# Altium footprint library ICs And Semiconductors THD.PcbLib: 350 footprints (part 11 of 22)
Each footprint in its own frame and in the unit in brackets; x right, y up, seen from the top. Pads: shape width x height; smd on the part's side, far side on the other; paste and mask are expansions set on the pad; w line width, h text height; cw(c..) or ccw(c..) is an arc to the next point about the centre after c.
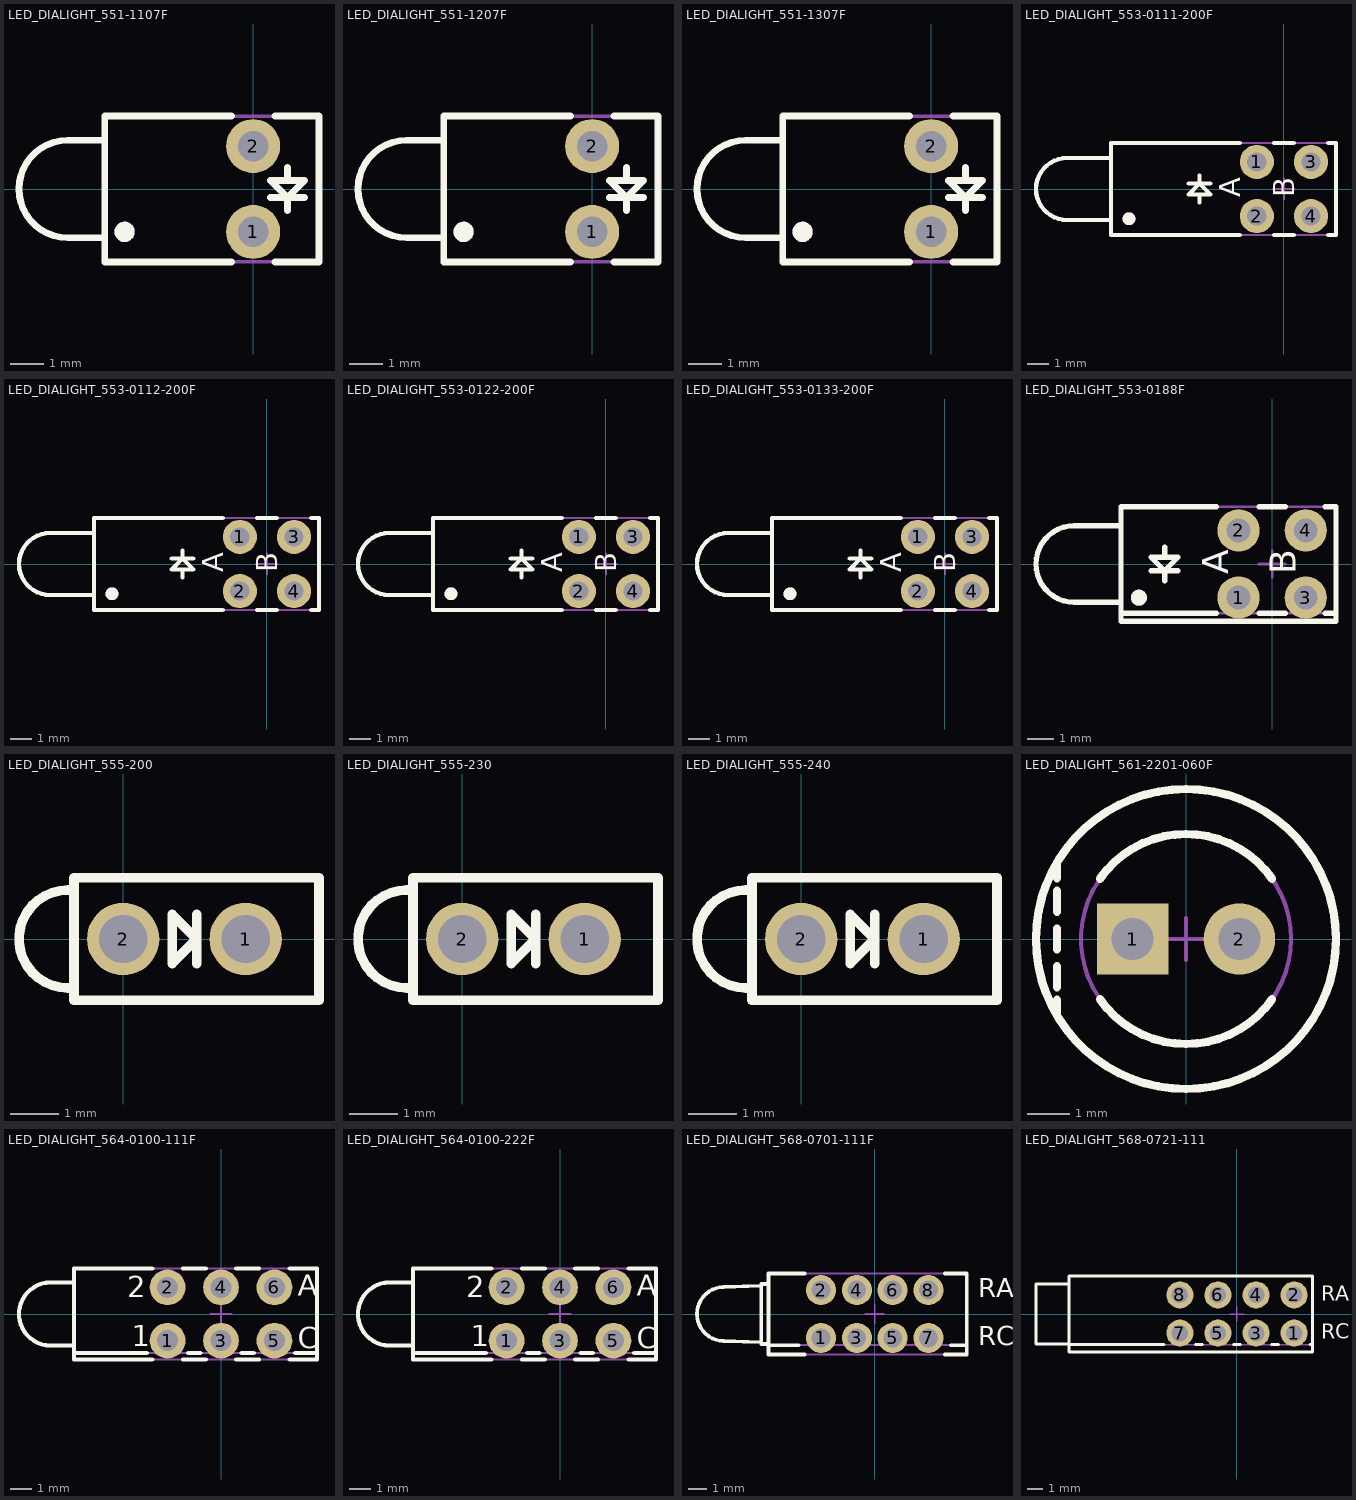
[diagram p10: the footprints below, top view; thin cyan lines are the x and y axes]

## LED_DIALIGHT_551-1107F [mm] "Single 3mm Red LED, Body 6.35x4.32mm, Pin spacing 2.54mm"
height 7.11
pads (2):
  round 1.6 hole 0.9: 1(0,-1.27) 2(0,1.27)
Top Overlay:
  circle w0.3: c-3.81,-1.27 r0.15
  lines w0.2: -4.4,-1.445 -5.495,-1.445 cw(c-5.495,0) -5.495,1.445 -4.4,1.445 ; -0.646,-2.16 -4.4,-2.16 -4.4,2.16 -0.646,2.16 ; 0.508,-0.254 1.524,-0.254 ; 0.646,-2.16 1.95,-2.16 1.95,2.16 0.646,2.16 ; 1.016,-0.635 1.016,-0.254 ; 1.016,0.254 1.016,0.635 ; 1.016,-0.254 1.524,0.254 0.508,0.254 1.016,-0.254
Notvisible:
  lines w0.1: -0.5,-1.27 0,-1.27 ; -0.5,1.27 0,1.27 ; 0,-1.77 0,-1.27 ; 0,-0.77 0,-1.27 ; 0,0.77 0,1.27 ; 0,1.77 0,1.27 ; 0.5,-1.27 0,-1.27 ; 0.5,1.27 0,1.27
Mechanical 14:
  circle w0.3: c-3.81,-1.27 r0.15
  lines w0.1: -4.4,-1.445 -5.495,-1.445 cw(c-5.495,0) -5.495,1.445 -4.4,1.445 ; 1.016,-0.635 1.016,-0.254 ; 1.016,0.254 1.016,0.635 ; 0.508,-0.254 1.524,-0.254 ; 0.508,-0.254 1.524,-0.254 ; 0.508,-0.254 1.524,-0.254 ; 0.508,0.254 1.524,0.254 ; 0.508,0.254 1.016,-0.254 ; 0.508,0.254 1.016,-0.254 ; 0.508,0.254 1.524,0.254 ; 0.508,0.254 1.524,0.254 ; 0.508,0.254 1.016,-0.254 ; 1.016,-0.254 1.524,0.254 ; 1.016,-0.254 1.524,0.254 ; 1.016,-0.254 1.524,0.254 ; -4.4,-2.16 1.95,-2.16 1.95,2.16 -4.4,2.16 -4.4,-2.16
3D body "LED_DIALIGHT_551-1107F.stp": height 7.11, standoff -3.68, extent -6.94,-2.16 1.95,2.16

## LED_DIALIGHT_551-1207F [mm] "Single 3mm Yellow LED, Body 6.35x4.32mm, Pin spacing 2.54mm"
height 7.11
pads (2):
  round 1.6 hole 0.9: 1(0,-1.27) 2(0,1.27)
Top Overlay:
  circle w0.3: c-3.81,-1.27 r0.15
  lines w0.2: -4.4,-1.445 -5.495,-1.445 cw(c-5.495,0) -5.495,1.445 -4.4,1.445 ; -0.646,-2.16 -4.4,-2.16 -4.4,2.16 -0.646,2.16 ; 0.508,-0.254 1.524,-0.254 ; 0.646,-2.16 1.95,-2.16 1.95,2.16 0.646,2.16 ; 1.016,-0.635 1.016,-0.254 ; 1.016,0.254 1.016,0.635 ; 1.016,-0.254 1.524,0.254 0.508,0.254 1.016,-0.254
Notvisible:
  lines w0.1: -0.5,-1.27 0,-1.27 ; -0.5,1.27 0,1.27 ; 0,-1.77 0,-1.27 ; 0,-0.77 0,-1.27 ; 0,0.77 0,1.27 ; 0,1.77 0,1.27 ; 0.5,-1.27 0,-1.27 ; 0.5,1.27 0,1.27
Mechanical 14:
  circle w0.3: c-3.81,-1.27 r0.15
  lines w0.1: -4.4,-1.445 -5.495,-1.445 cw(c-5.495,0) -5.495,1.445 -4.4,1.445 ; 1.016,-0.635 1.016,-0.254 ; 1.016,0.254 1.016,0.635 ; 0.508,-0.254 1.524,-0.254 ; 0.508,-0.254 1.524,-0.254 ; 0.508,-0.254 1.524,-0.254 ; 0.508,0.254 1.524,0.254 ; 0.508,0.254 1.016,-0.254 ; 0.508,0.254 1.016,-0.254 ; 0.508,0.254 1.524,0.254 ; 0.508,0.254 1.524,0.254 ; 0.508,0.254 1.016,-0.254 ; 1.016,-0.254 1.524,0.254 ; 1.016,-0.254 1.524,0.254 ; 1.016,-0.254 1.524,0.254 ; -4.4,-2.16 1.95,-2.16 1.95,2.16 -4.4,2.16 -4.4,-2.16
3D body "LED_DIALIGHT_551-1207F.stp": height 7.11, standoff -3.68, extent -6.94,-2.16 1.95,2.16

## LED_DIALIGHT_551-1307F [mm] "Single 3mm Green LED, Body 6.35x4.32mm, Pin spacing 2.54mm"
height 7.11
pads (2):
  round 1.6 hole 0.9: 1(0,-1.27) 2(0,1.27)
Top Overlay:
  circle w0.3: c-3.81,-1.27 r0.15
  lines w0.2: -4.4,-1.445 -5.495,-1.445 cw(c-5.495,0) -5.495,1.445 -4.4,1.445 ; -0.646,-2.16 -4.4,-2.16 -4.4,2.16 -0.646,2.16 ; 0.508,-0.254 1.524,-0.254 ; 0.646,-2.16 1.95,-2.16 1.95,2.16 0.646,2.16 ; 1.016,-0.635 1.016,-0.254 ; 1.016,0.254 1.016,0.635 ; 1.016,-0.254 0.508,0.254 1.524,0.254 1.016,-0.254
Notvisible:
  lines w0.1: -0.5,-1.27 0,-1.27 ; -0.5,1.27 0,1.27 ; 0,-1.77 0,-1.27 ; 0,-0.77 0,-1.27 ; 0,0.77 0,1.27 ; 0,1.77 0,1.27 ; 0.5,-1.27 0,-1.27 ; 0.5,1.27 0,1.27
Mechanical 14:
  circle w0.3: c-3.81,-1.27 r0.15
  lines w0.1: -4.4,-1.445 -5.495,-1.445 cw(c-5.495,0) -5.495,1.445 -4.4,1.445 ; 1.016,-0.635 1.016,-0.254 ; 1.016,0.254 1.016,0.635 ; 0.508,-0.254 1.524,-0.254 ; 0.508,-0.254 1.524,-0.254 ; 0.508,-0.254 1.524,-0.254 ; 0.508,0.254 1.016,-0.254 ; 0.508,0.254 1.524,0.254 ; 0.508,0.254 1.524,0.254 ; 0.508,0.254 1.016,-0.254 ; 0.508,0.254 1.016,-0.254 ; 0.508,0.254 1.524,0.254 ; 1.016,-0.254 1.524,0.254 ; 1.016,-0.254 1.524,0.254 ; 1.016,-0.254 1.524,0.254 ; -4.4,-2.16 -4.4,2.16 1.95,2.16 1.95,-2.16 -4.4,-2.16
3D body "LED_DIALIGHT_551-1307F.stp": height 7.11, standoff -3.68, extent -6.94,-2.16 1.95,2.16

## LED_DIALIGHT_553-0111-200F [mm] "Dual 3mm Red LED, Body 10.55x4.32mm, Pin spacing 2.54mm"
height 9.65
pads (4):
  round 1.6 hole 0.9: 1(-1.27,1.27) 2(-1.27,-1.27) 3(1.27,1.27) 4(1.27,-1.27)
Top Overlay:
  circle w0.3: c-7.262,-1.397 r0.15
  lines w0.2: -8.11,-1.45 -10.17,-1.45 cw(c-10.17,0) -10.17,1.45 -8.11,1.45 ; -4.464,0.254 -3.448,0.254 ; -3.956,-0.635 -3.956,-0.254 ; -3.956,0.635 -3.956,0.254 ; -2.075,-2.16 -8.11,-2.16 -8.11,2.16 -2.075,2.16 ; -0.465,-2.16 0.465,-2.16 ; -0.465,2.16 0.465,2.16 ; 2.075,-2.16 2.44,-2.16 2.44,2.16 2.075,2.16 ; -3.956,0.254 -4.464,-0.254 -3.448,-0.254 -3.956,0.254
  text "A" at -2.051,-0.381 h1
  text "B" at 0.489,-0.381 h1
Notvisible:
  lines w0.1: -1.77,-1.27 -1.27,-1.27 ; -1.77,1.27 -1.27,1.27 ; -1.27,-1.77 -1.27,-1.27 ; -1.27,-0.77 -1.27,-1.27 ; -1.27,0.77 -1.27,1.27 ; -1.27,1.77 -1.27,1.27 ; -0.77,-1.27 -1.27,-1.27 ; -0.77,1.27 -1.27,1.27 ; -0.5,0 0,0 ; 0,-0.5 0,0 ; 0,0.5 0,0 ; 0.5,0 0,0 ; 0.77,-1.27 1.27,-1.27 ; 0.77,1.27 1.27,1.27 ; 1.27,-1.77 1.27,-1.27 ; 1.27,-0.77 1.27,-1.27 ; 1.27,0.77 1.27,1.27 ; 1.27,1.77 1.27,1.27 ; 1.77,-1.27 1.27,-1.27 ; 1.77,1.27 1.27,1.27
Mechanical 14:
  circle w0.3: c-7.262,-1.397 r0.15
  lines w0.1: -8.11,-1.45 -10.17,-1.45 cw(c-10.17,0) -10.17,1.45 -8.11,1.45 ; -3.956,-0.635 -3.956,-0.254 ; -3.956,0.635 -3.956,0.254 ; -4.464,-0.254 -3.448,-0.254 ; -4.464,-0.254 -3.956,0.254 ; -4.464,-0.254 -3.956,0.254 ; -4.464,-0.254 -3.448,-0.254 ; -4.464,-0.254 -3.448,-0.254 ; -4.464,-0.254 -3.956,0.254 ; -4.464,0.254 -3.448,0.254 ; -4.464,0.254 -3.448,0.254 ; -4.464,0.254 -3.448,0.254 ; -3.956,0.254 -3.448,-0.254 ; -3.956,0.254 -3.448,-0.254 ; -3.956,0.254 -3.448,-0.254 ; -8.11,-2.16 2.44,-2.16 2.44,2.16 -8.11,2.16 -8.11,-2.16
  text "A" at -2.051,-0.381 h1
  text "B" at 0.489,-0.381 h1
3D body "LED_DIALIGHT_553-0111-200F.stp": height 9.65, standoff -3.68, extent -11.62,-2.16 2.44,2.16

## LED_DIALIGHT_553-0112-200F [mm] "Dual 3mm LED  (Top: Red, Bot: Green), Body 10.55x4.32mm, Pin spacing 2.54mm"
height 9.65
pads (4):
  round 1.6 hole 0.9: 1(-1.27,1.27) 2(-1.27,-1.27) 3(1.27,1.27) 4(1.27,-1.27)
Top Overlay:
  circle w0.3: c-7.262,-1.397 r0.15
  lines w0.2: -8.11,-1.45 -10.17,-1.45 cw(c-10.17,0) -10.17,1.45 -8.11,1.45 ; -4.464,0.254 -3.448,0.254 ; -3.956,-0.635 -3.956,-0.254 ; -3.956,0.635 -3.956,0.254 ; -2.075,-2.16 -8.11,-2.16 -8.11,2.16 -2.075,2.16 ; -0.465,-2.16 0.465,-2.16 ; -0.465,2.16 0.465,2.16 ; 2.075,-2.16 2.44,-2.16 2.44,2.16 2.075,2.16 ; -3.956,0.254 -3.448,-0.254 -4.464,-0.254 -3.956,0.254
  text "B" at 0.489,-0.381 h1
  text "A" at -2.051,-0.381 h1
Notvisible:
  lines w0.1: -1.77,-1.27 -1.27,-1.27 ; -1.77,1.27 -1.27,1.27 ; -1.27,-1.77 -1.27,-1.27 ; -1.27,-0.77 -1.27,-1.27 ; -1.27,0.77 -1.27,1.27 ; -1.27,1.77 -1.27,1.27 ; -0.77,-1.27 -1.27,-1.27 ; -0.77,1.27 -1.27,1.27 ; -0.5,0 0,0 ; 0,-0.5 0,0 ; 0,0.5 0,0 ; 0.5,0 0,0 ; 0.77,-1.27 1.27,-1.27 ; 0.77,1.27 1.27,1.27 ; 1.27,-1.77 1.27,-1.27 ; 1.27,-0.77 1.27,-1.27 ; 1.27,0.77 1.27,1.27 ; 1.27,1.77 1.27,1.27 ; 1.77,-1.27 1.27,-1.27 ; 1.77,1.27 1.27,1.27
Mechanical 14:
  circle w0.3: c-7.262,-1.397 r0.15
  lines w0.1: -8.11,-1.45 -10.17,-1.45 cw(c-10.17,0) -10.17,1.45 -8.11,1.45 ; -3.956,-0.635 -3.956,-0.254 ; -3.956,0.635 -3.956,0.254 ; -4.464,-0.254 -3.956,0.254 ; -4.464,-0.254 -3.448,-0.254 ; -4.464,-0.254 -3.448,-0.254 ; -4.464,-0.254 -3.956,0.254 ; -4.464,-0.254 -3.956,0.254 ; -4.464,-0.254 -3.448,-0.254 ; -4.464,0.254 -3.448,0.254 ; -4.464,0.254 -3.448,0.254 ; -4.464,0.254 -3.448,0.254 ; -3.956,0.254 -3.448,-0.254 ; -3.956,0.254 -3.448,-0.254 ; -3.956,0.254 -3.448,-0.254 ; -8.11,-2.16 2.44,-2.16 2.44,2.16 -8.11,2.16 -8.11,-2.16
  text "B" at 0.489,-0.381 h1
  text "A" at -2.051,-0.381 h1
3D body "LED_DIALIGHT_553-0112-200F.stp": height 9.65, standoff -3.68, extent -11.62,-2.16 2.44,2.16

## LED_DIALIGHT_553-0122-200F [mm] "Dual 3mm Green LED, Body 10.55x4.32mm, Pin spacing 2.54mm"
height 9.65
pads (4):
  round 1.6 hole 0.9: 1(-1.27,1.27) 2(-1.27,-1.27) 3(1.27,1.27) 4(1.27,-1.27)
Top Overlay:
  circle w0.3: c-7.262,-1.397 r0.15
  lines w0.2: -8.11,-1.45 -10.17,-1.45 cw(c-10.17,0) -10.17,1.45 -8.11,1.45 ; -4.464,0.254 -3.448,0.254 ; -3.956,-0.635 -3.956,-0.254 ; -3.956,0.635 -3.956,0.254 ; -2.075,-2.16 -8.11,-2.16 -8.11,2.16 -2.075,2.16 ; -0.465,-2.16 0.465,-2.16 ; -0.465,2.16 0.465,2.16 ; 2.075,-2.16 2.44,-2.16 2.44,2.16 2.075,2.16 ; -3.956,0.254 -4.464,-0.254 -3.448,-0.254 -3.956,0.254
  text "A" at -2.051,-0.381 h1
  text "B" at 0.489,-0.381 h1
Notvisible:
  lines w0.1: -1.77,-1.27 -1.27,-1.27 ; -1.77,1.27 -1.27,1.27 ; -1.27,-1.77 -1.27,-1.27 ; -1.27,-0.77 -1.27,-1.27 ; -1.27,0.77 -1.27,1.27 ; -1.27,1.77 -1.27,1.27 ; -0.77,-1.27 -1.27,-1.27 ; -0.77,1.27 -1.27,1.27 ; -0.5,0 0,0 ; 0,-0.5 0,0 ; 0,0.5 0,0 ; 0.5,0 0,0 ; 0.77,-1.27 1.27,-1.27 ; 0.77,1.27 1.27,1.27 ; 1.27,-1.77 1.27,-1.27 ; 1.27,-0.77 1.27,-1.27 ; 1.27,0.77 1.27,1.27 ; 1.27,1.77 1.27,1.27 ; 1.77,-1.27 1.27,-1.27 ; 1.77,1.27 1.27,1.27
Mechanical 14:
  circle w0.3: c-7.262,-1.397 r0.15
  lines w0.1: -8.11,-1.45 -10.17,-1.45 cw(c-10.17,0) -10.17,1.45 -8.11,1.45 ; -3.956,-0.635 -3.956,-0.254 ; -3.956,0.635 -3.956,0.254 ; -4.464,-0.254 -3.448,-0.254 ; -4.464,-0.254 -3.956,0.254 ; -4.464,-0.254 -3.956,0.254 ; -4.464,-0.254 -3.448,-0.254 ; -4.464,-0.254 -3.448,-0.254 ; -4.464,-0.254 -3.956,0.254 ; -4.464,0.254 -3.448,0.254 ; -4.464,0.254 -3.448,0.254 ; -4.464,0.254 -3.448,0.254 ; -3.956,0.254 -3.448,-0.254 ; -3.956,0.254 -3.448,-0.254 ; -3.956,0.254 -3.448,-0.254 ; -8.11,-2.16 -8.11,2.16 2.44,2.16 2.44,-2.16 -8.11,-2.16
  text "A" at -2.051,-0.381 h1
  text "B" at 0.489,-0.381 h1
3D body "LED_DIALIGHT_553-0122-200F.stp": height 9.65, standoff -3.68, extent -11.62,-2.16 2.44,2.16

## LED_DIALIGHT_553-0133-200F [mm] "Dual 3mm Yellow LED, Body 10.55x4.32mm, Pin spacing 2.54mm"
height 9.65
pads (4):
  round 1.6 hole 0.9: 1(-1.27,1.27) 2(-1.27,-1.27) 3(1.27,1.27) 4(1.27,-1.27)
Top Overlay:
  circle w0.3: c-7.262,-1.397 r0.15
  lines w0.2: -8.11,-1.45 -10.17,-1.45 cw(c-10.17,0) -10.17,1.45 -8.11,1.45 ; -4.464,0.254 -3.448,0.254 ; -3.956,-0.635 -3.956,-0.254 ; -3.956,0.635 -3.956,0.254 ; -2.075,-2.16 -8.11,-2.16 -8.11,2.16 -2.075,2.16 ; -0.465,-2.16 0.465,-2.16 ; -0.465,2.16 0.465,2.16 ; 2.075,-2.16 2.44,-2.16 2.44,2.16 2.075,2.16 ; -3.956,0.254 -4.464,-0.254 -3.448,-0.254 -3.956,0.254
  text "A" at -2.051,-0.381 h1
  text "B" at 0.489,-0.381 h1
Notvisible:
  lines w0.1: -1.77,-1.27 -1.27,-1.27 ; -1.77,1.27 -1.27,1.27 ; -1.27,-1.77 -1.27,-1.27 ; -1.27,-0.77 -1.27,-1.27 ; -1.27,0.77 -1.27,1.27 ; -1.27,1.77 -1.27,1.27 ; -0.77,-1.27 -1.27,-1.27 ; -0.77,1.27 -1.27,1.27 ; -0.5,0 0,0 ; 0,-0.5 0,0 ; 0,0.5 0,0 ; 0.5,0 0,0 ; 0.77,-1.27 1.27,-1.27 ; 0.77,1.27 1.27,1.27 ; 1.27,-1.77 1.27,-1.27 ; 1.27,-0.77 1.27,-1.27 ; 1.27,0.77 1.27,1.27 ; 1.27,1.77 1.27,1.27 ; 1.77,-1.27 1.27,-1.27 ; 1.77,1.27 1.27,1.27
Mechanical 14:
  circle w0.3: c-7.262,-1.397 r0.15
  lines w0.1: -8.11,-1.45 -10.17,-1.45 cw(c-10.17,0) -10.17,1.45 -8.11,1.45 ; -3.956,-0.635 -3.956,-0.254 ; -3.956,0.635 -3.956,0.254 ; -4.464,-0.254 -3.448,-0.254 ; -4.464,-0.254 -3.956,0.254 ; -4.464,-0.254 -3.956,0.254 ; -4.464,-0.254 -3.448,-0.254 ; -4.464,-0.254 -3.448,-0.254 ; -4.464,-0.254 -3.956,0.254 ; -4.464,0.254 -3.448,0.254 ; -4.464,0.254 -3.448,0.254 ; -4.464,0.254 -3.448,0.254 ; -3.956,0.254 -3.448,-0.254 ; -3.956,0.254 -3.448,-0.254 ; -3.956,0.254 -3.448,-0.254 ; -8.11,-2.16 -8.11,2.16 2.44,2.16 2.44,-2.16 -8.11,-2.16
  text "A" at -2.051,-0.381 h1
  text "B" at 0.489,-0.381 h1
3D body "LED_DIALIGHT_553-0133-200F.stp": height 9.65, standoff -3.68, extent -11.62,-2.16 2.44,2.16

## LED_DIALIGHT_553-0188F [mm] "Dual 3mm Blue LED, Body 8.1x4.3mm, Pin spacing 2.54mm"
height 9.65
pads (4):
  round 1.6 hole 0.9: 1(-1.27,-1.27) 2(-1.27,1.27) 3(1.27,-1.27) 4(1.27,1.27)
Top Overlay:
  circle w0.3: c-5.037,-1.272 r0.15
  lines w0.2: -5.715,-1.86 -2.1,-1.86 ; -5.715,-1.45 -7.475,-1.45 cw(c-7.475,0) -7.475,1.45 -5.715,1.45 ; -4.572,-0.254 -3.556,-0.254 ; -4.064,-0.635 -4.064,-0.254 ; -4.064,0.254 -4.064,0.635 ; -2.1,2.16 -5.715,2.16 -5.715,-2.16 2.413,-2.16 2.413,2.16 2,2.16 ; -0.5,-1.86 0.5,-1.86 ; -0.5,2.16 0.5,2.16 ; 2,-1.86 2.413,-1.86 ; -4.064,-0.254 -3.556,0.254 -4.572,0.254 -4.064,-0.254
  text "A" at -1.651,-0.381 h1
  text "B" at 0.889,-0.381 h1
Notvisible:
  lines w0.1: -1.77,-1.27 -1.27,-1.27 ; -1.77,1.27 -1.27,1.27 ; -1.27,-1.77 -1.27,-1.27 ; -1.27,-0.77 -1.27,-1.27 ; -1.27,0.77 -1.27,1.27 ; -1.27,1.77 -1.27,1.27 ; -0.77,-1.27 -1.27,-1.27 ; -0.77,1.27 -1.27,1.27 ; -0.5,0 0,0 ; 0,-0.5 0,0 ; 0,0.5 0,0 ; 0.5,0 0,0 ; 0.77,-1.27 1.27,-1.27 ; 0.77,1.27 1.27,1.27 ; 1.27,-1.77 1.27,-1.27 ; 1.27,-0.77 1.27,-1.27 ; 1.27,0.77 1.27,1.27 ; 1.27,1.77 1.27,1.27 ; 1.77,-1.27 1.27,-1.27 ; 1.77,1.27 1.27,1.27
Mechanical 14:
  circle w0.3: c-5.037,-1.272 r0.15
  lines w0.1: -5.715,-1.86 2.413,-1.86 ; -5.715,-1.45 -7.475,-1.45 cw(c-7.475,0) -7.475,1.45 -5.715,1.45 ; -4.064,-0.635 -4.064,-0.254 ; -4.064,0.254 -4.064,0.635 ; -4.572,-0.254 -3.556,-0.254 ; -4.572,-0.254 -3.556,-0.254 ; -4.572,-0.254 -3.556,-0.254 ; -4.572,0.254 -3.556,0.254 ; -4.572,0.254 -4.064,-0.254 ; -4.572,0.254 -4.064,-0.254 ; -4.572,0.254 -3.556,0.254 ; -4.572,0.254 -3.556,0.254 ; -4.572,0.254 -4.064,-0.254 ; -4.064,-0.254 -3.556,0.254 ; -4.064,-0.254 -3.556,0.254 ; -4.064,-0.254 -3.556,0.254 ; -5.715,-2.16 2.413,-2.16 2.413,2.16 -5.715,2.16 -5.715,-2.16
  text "A" at -1.651,-0.381 h1
  text "B" at 0.889,-0.381 h1
3D body "LED_DIALIGHT_553-0188F.stp": height 9.65, standoff -3.68, extent -8.925,-2.16 2.413,2.16

## LED_DIALIGHT_555-200 [mm] "Single 2mm Red LED, Body 5.08x2.54mm, Pin spacing 2.54mm"
height 6.35
pads (2):
  round 1.5 hole 1: 1(2.54,0) 2(0,0)
Top Overlay:
  lines w0.2: -1.02,-1.015 -1.145,-1.015 cw(c-1.145,0) -1.145,1.015 -1.02,1.015 ; 1.524,-0.508 1.524,0.508 ; -1.02,-1.27 4.06,-1.27 4.06,1.27 -1.02,1.27 -1.02,-1.27 ; 1.016,-0.508 1.524,0 1.016,0.508 1.016,-0.508
Notvisible:
  lines w0.05: -0.127,-0.343 -0.127,0.343 0.127,0.343 0.127,-0.343 -0.127,-0.343 ; 2.413,-0.343 2.413,0.343 2.667,0.343 2.667,-0.343 2.413,-0.343
Mechanical 14:
  lines w0.1: -1.02,-1.015 -1.145,-1.015 cw(c-1.145,0) -1.145,1.015 -1.02,1.015 ; 1.524,-0.508 1.524,0.508 ; -1.02,-1.27 4.06,-1.27 4.06,1.27 -1.02,1.27 -1.02,-1.27 ; 1.016,-0.508 1.524,0 1.016,0.508 1.016,-0.508
3D body "LED_DIALIGHT_555-200.stp": height 6.35, standoff -3.6, extent -2.16,-1.27 4.06,1.27

## LED_DIALIGHT_555-230 [mm] "Single 2mm Green LED, Body 5.08x2.54mm, Pin spacing 2.54mm"
height 6.35
pads (2):
  round 1.5 hole 1: 1(2.54,0) 2(0,0)
Top Overlay:
  lines w0.2: -1.02,-1.015 -1.145,-1.015 cw(c-1.145,0) -1.145,1.015 -1.02,1.015 ; 1.524,-0.508 1.524,0.508 ; -1.02,-1.27 4.06,-1.27 4.06,1.27 -1.02,1.27 -1.02,-1.27 ; 1.016,-0.508 1.524,0 1.016,0.508 1.016,-0.508
Notvisible:
  lines w0.05: -0.127,-0.343 -0.127,0.343 0.127,0.343 0.127,-0.343 -0.127,-0.343 ; 2.413,-0.343 2.413,0.343 2.667,0.343 2.667,-0.343 2.413,-0.343
Mechanical 14:
  lines w0.1: -1.02,-1.015 -1.145,-1.015 cw(c-1.145,0) -1.145,1.015 -1.02,1.015 ; 1.524,-0.508 1.524,0.508 ; -1.02,-1.27 4.06,-1.27 4.06,1.27 -1.02,1.27 -1.02,-1.27 ; 1.016,-0.508 1.524,0 1.016,0.508 1.016,-0.508
3D body "LED_DIALIGHT_555-230.stp": height 6.35, standoff -3.6, extent -2.16,-1.27 4.06,1.27

## LED_DIALIGHT_555-240 [mm] "Single 2mm Yellow LED, Body 5.08x2.54mm, Pin spacing 2.54mm"
height 6.35
pads (2):
  round 1.5 hole 1: 1(2.54,0) 2(0,0)
Top Overlay:
  lines w0.2: -1.02,-1.015 -1.145,-1.015 cw(c-1.145,0) -1.145,1.015 -1.02,1.015 ; 1.524,-0.508 1.524,0.508 ; -1.02,-1.27 4.06,-1.27 4.06,1.27 -1.02,1.27 -1.02,-1.27 ; 1.016,-0.508 1.524,0 1.016,0.508 1.016,-0.508
Notvisible:
  lines w0.05: -0.127,-0.343 -0.127,0.343 0.127,0.343 0.127,-0.343 -0.127,-0.343 ; 2.413,-0.343 2.413,0.343 2.667,0.343 2.667,-0.343 2.413,-0.343
Mechanical 14:
  lines w0.1: -1.02,-1.015 -1.145,-1.015 cw(c-1.145,0) -1.145,1.015 -1.02,1.015 ; 1.524,-0.508 1.524,0.508 ; -1.02,-1.27 4.06,-1.27 4.06,1.27 -1.02,1.27 -1.02,-1.27 ; 1.016,-0.508 1.524,0 1.016,0.508 1.016,-0.508
3D body "LED_DIALIGHT_555-240.stp": height 6.35, standoff -3.6, extent -2.16,-1.27 4.06,1.27

## LED_DIALIGHT_561-2201-060F [mm] "Single Vertical 5mm Green LED With Housing Stand-off (D 7.1mmx H 9.52mm), Overall Height 15.24mm"
height 15.24
pads (2):
  rect 1.7x1.7 hole 1: 1(-1.27,0)
  round 1.7 hole 1: 2(1.27,0)
Top Overlay:
  circle w0.2: c0,0 r3.57
  lines w0.2: -3.07,-1.822 -3.07,-1.45 ; -3.07,-1.15 -3.07,-0.65 ; -3.07,-0.25 -3.07,0.25 ; -3.07,0.65 -3.07,1.15 ; -3.07,1.45 -3.07,1.822 ; -2.048,-1.434 ccw(c0,0) 2.048,-1.434 ; -2.048,1.434 cw(c0,0) 2.048,1.434
Notvisible:
  lines w0.1: -1.77,0 -1.27,0 ; -1.27,-0.5 -1.27,0 ; -1.27,0.5 -1.27,0 ; -0.77,0 -1.27,0 ; -0.5,0 0,0 ; 0,-0.5 0,0 ; 0,0.5 0,0 ; 0.5,0 0,0 ; 0.77,0 1.27,0 ; 1.27,-0.5 1.27,0 ; 1.27,0.5 1.27,0 ; 1.77,0 1.27,0
Mechanical 14:
  circle w0.1: c0,0 r3.57
  circle w0.1: c0,0 r2.5
  lines w0.1: -3.07,-1.822 -3.07,-1.45 ; -3.07,-1.15 -3.07,-0.65 ; -3.07,-0.25 -3.07,0.25 ; -3.07,0.65 -3.07,1.15 ; -3.07,1.45 -3.07,1.822
3D body "LED_DIALIGHT_561-2201-060F.stp": height 15.24, standoff -3.8, extent -3.57,-3.57 3.57,3.57

## LED_DIALIGHT_564-0100-111F [mm] "3x Red LED 3mm PCB Edge Mounting DIALIGHT 564 Serie"
height 15.24
pads (6):
  round 1.7 hole 1: 1(-2.54,-1.27) 2(-2.54,1.27) 3(0,-1.27) 4(0,1.27) 5(2.54,-1.27) 6(2.54,1.27)
Top Overlay:
  lines w0.2: -6.99,-1.86 -3.527,-1.86 ; -6.99,-1.5 -8.106,-1.5 cw(c-8.106,0) -8.106,1.5 -6.99,1.5 ; -3.268,-2.16 -6.99,-2.16 -6.99,2.16 -3.268,2.16 ; -1.812,-2.16 -0.728,-2.16 ; -1.812,2.16 -0.728,2.16 ; -1.553,-1.86 -0.987,-1.86 ; 0.728,-2.16 1.812,-2.16 ; 0.728,2.16 1.812,2.16 ; 0.987,-1.86 1.553,-1.86 ; 3.268,-2.16 4.57,-2.16 4.57,2.16 3.268,2.16 ; 3.527,-1.86 4.57,-1.86
  text "1" at -4.243,-1.53 h1
  text "2" at -4.458,0.79 h1
  text "C" at 3.66,-1.635 h1
  text "A" at 3.66,0.86 h1
Notvisible:
  lines w0.1: -3.04,-1.27 -2.54,-1.27 ; -3.04,1.27 -2.54,1.27 ; -2.54,-1.77 -2.54,-1.27 ; -2.54,-0.77 -2.54,-1.27 ; -2.54,0.77 -2.54,1.27 ; -2.54,1.77 -2.54,1.27 ; -2.04,-1.27 -2.54,-1.27 ; -2.04,1.27 -2.54,1.27 ; -0.5,-1.27 0,-1.27 ; -0.5,0 0,0 ; -0.5,1.27 0,1.27 ; 0,-1.77 0,-1.27 ; 0,-0.77 0,-1.27 ; 0,-0.5 0,0 ; 0,0.5 0,0 ; 0,0.77 0,1.27 ; 0,1.77 0,1.27 ; 0.5,-1.27 0,-1.27 ; 0.5,0 0,0 ; 0.5,1.27 0,1.27 ; 2.04,-1.27 2.54,-1.27 ; 2.04,1.27 2.54,1.27 ; 2.54,-1.77 2.54,-1.27 ; 2.54,-0.77 2.54,-1.27 ; 2.54,0.77 2.54,1.27 ; 2.54,1.77 2.54,1.27 ; 3.04,-1.27 2.54,-1.27 ; 3.04,1.27 2.54,1.27
Mechanical 14:
  lines w0.1: -6.99,-1.86 4.57,-1.86 ; -6.99,-1.5 -8.106,-1.5 cw(c-8.106,0) -8.106,1.5 -6.99,1.5 ; -6.99,-2.16 -6.99,2.16 4.57,2.16 4.57,-2.16 -6.99,-2.16
  text "1" at -4.243,-1.53 h1
  text "2" at -4.458,0.79 h1
  text "C" at 3.66,-1.635 h1
  text "A" at 3.66,0.86 h1
3D body "LED_DIALIGHT_564-0100-111F.stp": height 15.24, standoff -3.2, extent -9.606,-2.16 4.57,2.16

## LED_DIALIGHT_564-0100-222F [mm] "3x Green LED 3mm PCB Edge Mounting DIALIGHT 564 Serie"
height 15.24
pads (6):
  round 1.7 hole 1: 1(-2.54,-1.27) 2(-2.54,1.27) 3(0,-1.27) 4(0,1.27) 5(2.54,-1.27) 6(2.54,1.27)
Top Overlay:
  lines w0.2: -6.99,-1.86 -3.527,-1.86 ; -6.99,-1.5 -8.106,-1.5 cw(c-8.106,0) -8.106,1.5 -6.99,1.5 ; -3.268,-2.16 -6.99,-2.16 -6.99,2.16 -3.268,2.16 ; -1.812,-2.16 -0.728,-2.16 ; -1.812,2.16 -0.728,2.16 ; -1.553,-1.86 -0.987,-1.86 ; 0.728,-2.16 1.812,-2.16 ; 0.728,2.16 1.812,2.16 ; 0.987,-1.86 1.553,-1.86 ; 3.268,-2.16 4.57,-2.16 4.57,2.16 3.268,2.16 ; 3.527,-1.86 4.57,-1.86
  text "1" at -4.243,-1.53 h1
  text "2" at -4.458,0.79 h1
  text "C" at 3.66,-1.635 h1
  text "A" at 3.66,0.86 h1
Notvisible:
  lines w0.1: -3.04,-1.27 -2.54,-1.27 ; -3.04,1.27 -2.54,1.27 ; -2.54,-1.77 -2.54,-1.27 ; -2.54,-0.77 -2.54,-1.27 ; -2.54,0.77 -2.54,1.27 ; -2.54,1.77 -2.54,1.27 ; -2.04,-1.27 -2.54,-1.27 ; -2.04,1.27 -2.54,1.27 ; -0.5,-1.27 0,-1.27 ; -0.5,0 0,0 ; -0.5,1.27 0,1.27 ; 0,-1.77 0,-1.27 ; 0,-0.77 0,-1.27 ; 0,-0.5 0,0 ; 0,0.5 0,0 ; 0,0.77 0,1.27 ; 0,1.77 0,1.27 ; 0.5,-1.27 0,-1.27 ; 0.5,0 0,0 ; 0.5,1.27 0,1.27 ; 2.04,-1.27 2.54,-1.27 ; 2.04,1.27 2.54,1.27 ; 2.54,-1.77 2.54,-1.27 ; 2.54,-0.77 2.54,-1.27 ; 2.54,0.77 2.54,1.27 ; 2.54,1.77 2.54,1.27 ; 3.04,-1.27 2.54,-1.27 ; 3.04,1.27 2.54,1.27
Mechanical 14:
  lines w0.1: -6.99,-1.86 4.57,-1.86 ; -6.99,-1.5 -8.106,-1.5 cw(c-8.106,0) -8.106,1.5 -6.99,1.5 ; -6.99,-2.16 -6.99,2.16 4.57,2.16 4.57,-2.16 -6.99,-2.16
  text "1" at -4.243,-1.53 h1
  text "2" at -4.458,0.79 h1
  text "C" at 3.66,-1.635 h1
  text "A" at 3.66,0.86 h1
3D body "LED_DIALIGHT_564-0100-222F.stp": height 15.24, standoff -3.2, extent -9.606,-2.16 4.57,2.16

## LED_DIALIGHT_568-0701-111F [mm] "Quad-Level 4x3mm Bi-Color Red/Green, LED CBI Circuit Board Indicator"
height 20.32
pads (8):
  round 1.6 hole 1: 1(-2.857,-1.27) 2(-2.857,1.27) 3(-0.952,-1.27) 4(-0.952,1.27) 5(0.953,-1.27) 6(0.953,1.27) 7(2.858,-1.27) 8(2.858,1.27)
Top Overlay:
  lines w0.2: -6.032,-1.499 -8.05,-1.441 cw(c-8.014,0) -8.05,1.441 -6.032,1.499 ; -5.651,-1.659 -4.045,-1.659 ; -5.651,-1.6 -6.032,-1.6 -6.032,1.6 -5.651,1.6 ; -3.736,-2.159 -5.651,-2.159 -5.651,2.159 -3.736,2.159 ; 3.736,-2.159 4.89,-2.159 4.89,2.159 3.736,2.159 ; 4.045,-1.659 4.89,-1.659
  text "RC" at 5.502,-1.651 h1
  text "RA" at 5.502,0.889 h1
Notvisible:
  lines w0.1: -3.357,-1.27 -2.857,-1.27 ; -3.357,1.27 -2.857,1.27 ; -2.857,-1.77 -2.857,-1.27 ; -2.857,-0.77 -2.857,-1.27 ; -2.857,0.77 -2.857,1.27 ; -2.857,1.77 -2.857,1.27 ; -2.357,-1.27 -2.857,-1.27 ; -2.357,1.27 -2.857,1.27 ; -1.452,-1.27 -0.952,-1.27 ; -1.452,1.27 -0.952,1.27 ; -0.952,-1.77 -0.952,-1.27 ; -0.952,-0.77 -0.952,-1.27 ; -0.952,0.77 -0.952,1.27 ; -0.952,1.77 -0.952,1.27 ; -0.5,0 0,0 ; -0.452,-1.27 -0.952,-1.27 ; -0.452,1.27 -0.952,1.27 ; 0,-0.5 0,0 ; 0,0.5 0,0 ; 0.453,-1.27 0.953,-1.27 ; 0.453,1.27 0.953,1.27 ; 0.5,0 0,0 ; 0.953,-1.77 0.953,-1.27 ; 0.953,-0.77 0.953,-1.27 ; 0.953,0.77 0.953,1.27 ; 0.953,1.77 0.953,1.27 ; 1.453,-1.27 0.953,-1.27 ; 1.453,1.27 0.953,1.27 ; 2.358,-1.27 2.858,-1.27 ; 2.358,1.27 2.858,1.27 ; 2.858,-1.77 2.858,-1.27 ; 2.858,-0.77 2.858,-1.27 ; 2.858,0.77 2.858,1.27 ; 2.858,1.77 2.858,1.27 ; 3.358,-1.27 2.858,-1.27 ; 3.358,1.27 2.858,1.27
Mechanical 14:
  lines w0.1: -6.032,-1.499 -8.05,-1.441 cw(c-8.014,0) -8.05,1.441 -6.032,1.499 ; -5.651,-1.659 4.89,-1.659 ; -5.651,-1.6 -6.032,-1.6 -6.032,1.6 -5.651,1.6 ; -5.651,-2.159 4.89,-2.159 4.89,2.159 -5.651,2.159 -5.651,-2.159
  text "RC" at 5.503,-1.651 h1
  text "RA" at 5.503,0.889 h1
3D body "LED_DIALIGHT_568-0701-111F.stp": height 20.32, standoff -3.68, extent -9.455,-2.159 4.89,2.159

## LED_DIALIGHT_568-0721-111 [mm] "Quad-Level 4x2mm Rectangular Bi-Color Red/Green, LED CBI Circuit Board Indicator"
height 12.7
pads (8):
  round 1.8 hole 1.1: 1(3.81,-1.27) 2(3.81,1.27) 3(1.27,-1.27) 4(1.27,1.27) 5(-1.27,-1.27) 6(-1.27,1.27) 7(-3.81,-1.27) 8(-3.81,1.27)
Top Overlay:
  lines w0.2: -11.2,-2.04 -4.857,-2.04 ; -11.2,-1.995 -13.41,-1.995 -13.41,1.995 -11.2,1.995 ; -2.763,-2.04 -2.317,-2.04 ; -0.223,-2.04 0.223,-2.04 ; 2.317,-2.04 2.763,-2.04 ; 4.857,-2.04 5.03,-2.04 ; -11.2,-2.54 -11.2,2.54 5.03,2.54 5.03,-2.54 -11.2,-2.54
  text "RA" at 5.605,0.889 h1
  text "RC" at 5.605,-1.651 h1
Notvisible:
  lines w0.1: -4.31,-1.27 -3.81,-1.27 ; -4.31,1.27 -3.81,1.27 ; -3.81,-1.77 -3.81,-1.27 ; -3.81,-0.77 -3.81,-1.27 ; -3.81,0.77 -3.81,1.27 ; -3.81,1.77 -3.81,1.27 ; -3.31,-1.27 -3.81,-1.27 ; -3.31,1.27 -3.81,1.27 ; -1.77,-1.27 -1.27,-1.27 ; -1.77,1.27 -1.27,1.27 ; -1.27,-1.77 -1.27,-1.27 ; -1.27,-0.77 -1.27,-1.27 ; -1.27,0.77 -1.27,1.27 ; -1.27,1.77 -1.27,1.27 ; -0.77,-1.27 -1.27,-1.27 ; -0.77,1.27 -1.27,1.27 ; -0.5,0 0,0 ; 0,-0.5 0,0 ; 0,0.5 0,0 ; 0.5,0 0,0 ; 0.77,-1.27 1.27,-1.27 ; 0.77,1.27 1.27,1.27 ; 1.27,-1.77 1.27,-1.27 ; 1.27,-0.77 1.27,-1.27 ; 1.27,0.77 1.27,1.27 ; 1.27,1.77 1.27,1.27 ; 1.77,-1.27 1.27,-1.27 ; 1.77,1.27 1.27,1.27 ; 3.31,-1.27 3.81,-1.27 ; 3.31,1.27 3.81,1.27 ; 3.81,-1.77 3.81,-1.27 ; 3.81,-0.77 3.81,-1.27 ; 3.81,0.77 3.81,1.27 ; 3.81,1.77 3.81,1.27 ; 4.31,-1.27 3.81,-1.27 ; 4.31,1.27 3.81,1.27
Mechanical 14:
  lines w0.1: -11.2,-2.04 5.03,-2.04 ; -11.2,-1.995 -13.41,-1.995 -13.41,1.995 -11.2,1.995 ; -11.2,-2.54 -11.2,2.54 5.03,2.54 5.03,-2.54 -11.2,-2.54
  text "RC" at 5.605,-1.651 h1
  text "RA" at 5.605,0.889 h1
3D body "LED_DIALIGHT_568-0721-111.stp": height 12.7, standoff -3.05, extent -13.41,-2.54 5.03,2.54